# Altium footprint library Hare_Library.PcbLib: 252 footprints (part 4 of 16)
Each footprint in its own frame and in the unit in brackets; x right, y up, seen from the top. Pads: shape width x height; smd on the part's side, far side on the other; paste and mask are expansions set on the pad; w line width, h text height; cw(c..) or ccw(c..) is an arc to the next point about the centre after c.
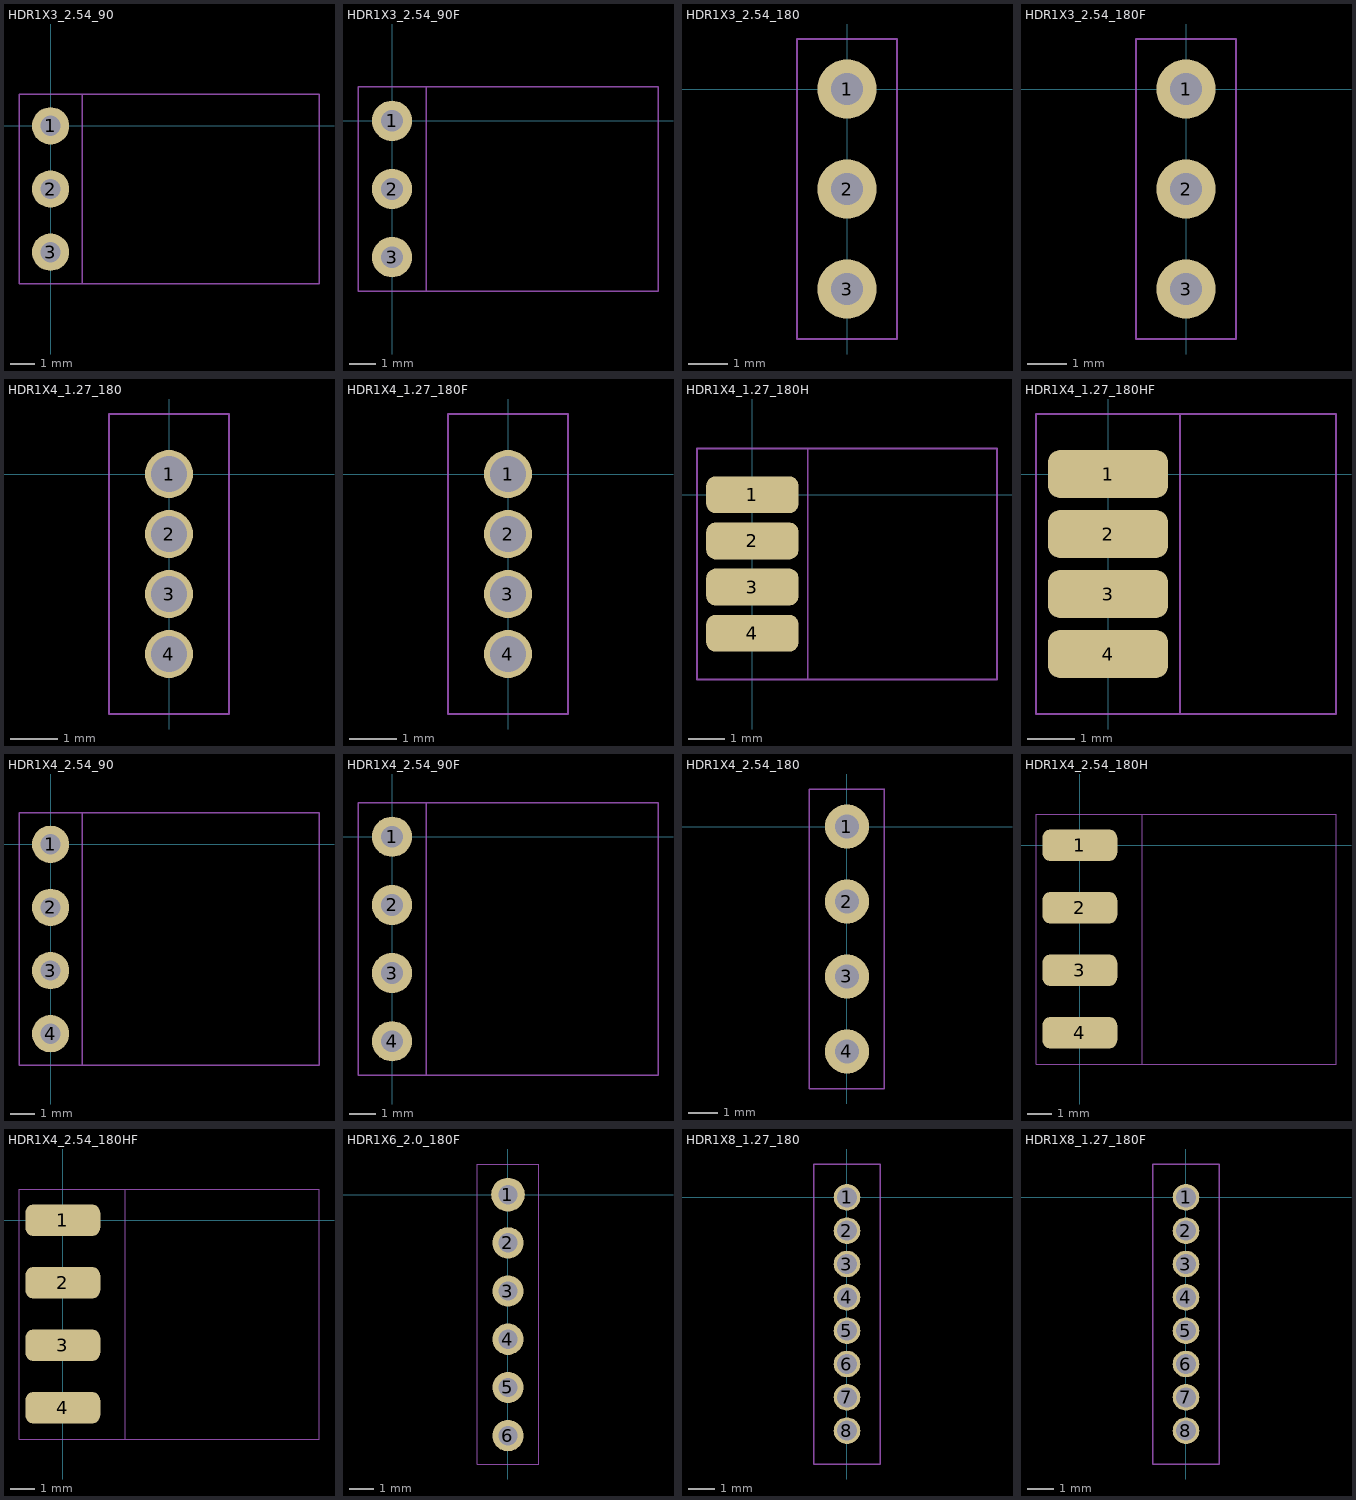
[diagram p3: the footprints below, top view; thin cyan lines are the x and y axes]

## HDR1X3_2.54_90 [mm]
height 4.3
pads (3):
  round 1.5 hole 0.813: 1(0,0) 2(0,-2.54) 3(0,-5.08)
Mechanical 13:
  lines w0.051: -1.27,-6.35 -1.27,1.27 10.795,1.27 10.795,-6.35 -1.27,-6.35
Mechanical 14:
  lines w0.051: -1.27,-6.35 1.27,-6.35 1.27,1.27 -1.27,1.27 -1.27,-6.35
3D body "pin_header_aw140-ea-g03g.stp": height 2.52, standoff -2.38, extent -0.381,-6.25 10.759,1.17

## HDR1X3_2.54_90F [mm]
height 4.3
pads (3):
  round 1.5 hole 0.813: 1(0,0) 2(0,-2.54) 3(0,-5.08)
Mechanical 13:
  lines w0.051: -1.27,-6.35 9.906,-6.35 9.906,1.27 -1.27,1.27 -1.27,-6.35
Mechanical 14:
  lines w0.051: -1.27,-6.35 -1.27,1.27 1.27,1.27 1.27,-6.35 -1.27,-6.35
3D body "female_header_a-bl254-ea-g03d.stp": height 2.52, standoff -3.18, extent -0.254,-6.475 9.806,1.395

## HDR1X3_2.54_180 [mm]
height 4.3
pads (3):
  round 1.5 hole 0.813: 1(0,0) 2(0,-2.54) 3(0,-5.08)
Mechanical 13:
  lines w0.051: -1.27,-6.35 1.27,-6.35 1.27,1.27 -1.27,1.27 -1.27,-6.35
Mechanical 14:
  lines w0.051: -1.27,-6.35 1.27,-6.35 1.27,1.27 -1.27,1.27 -1.27,-6.35
3D body "pin_header_aw140-eg-g03d.stp": height 8.2, standoff -3, extent -1.249,-6.35 1.249,1.27

## HDR1X3_2.54_180F [mm]
height 4.3
pads (3):
  round 1.5 hole 0.813: 1(0,0) 2(0,-2.54) 3(0,-5.08)
Mechanical 13:
  lines w0.051: -1.27,-6.35 1.27,-6.35 1.27,1.27 -1.27,1.27 -1.27,-6.35
Mechanical 14:
  lines w0.051: -1.27,-6.35 1.27,-6.35 1.27,1.27 -1.27,1.27 -1.27,-6.35
3D body "female_header_a-bl254-eg-g03d.stp": height 8.5, standoff -3.2, extent -1.25,-6.475 1.25,1.395

## HDR1X4_1.27_180 [mil]
height 169.29
pads (4):
  round 40 hole 30: 1(0,0) 2(0,-50) 3(0,-100) 4(0,-150)
Mechanical 13:
  lines w2: -50,-200 50,-200 50,50 -50,50 -50,-200
Mechanical 14:
  lines w2: -50,-200 50,-200 50,50 -50,50 -50,-200
3D body "pin_header_a-sl127-eg-g04d.stp": height 210.24, standoff -102.36, extent -49.21,-174.99 49.21,25.01

## HDR1X4_1.27_180F [mil]
height 169.29
pads (4):
  round 40 hole 30: 1(0,0) 2(0,-50) 3(0,-100) 4(0,-150)
Mechanical 13:
  lines w2: -50,-200 50,-200 50,50 -50,50 -50,-200
Mechanical 14:
  lines w2: -50,-200 50,-200 50,50 -50,50 -50,-200
3D body "female_header_a-bl127-eg-g04d.stp": height 133.86, standoff -94.49, extent -35.87,-182.88 35,32.88

## HDR1X4_1.27_180H [mil]
height 169.29
pads (4):
  rrect50% 100x40 smd: 1(0,0) 2(0,-50) 3(0,-100) 4(0,-150)
Mechanical 13:
  lines w2: -60,-200 -60,50 265,50 265,-200 -60,-200
Mechanical 14:
  lines w2: -60,-200 -60,50 60,50 60,-200 -60,-200
3D body "pin_header_a-sl127-eg-g04d.stp": height 59.21, standoff -39.21, extent -47.36,-174.99 265.24,25.01

## HDR1X4_1.27_180HF [mil]
height 169.29
pads (4):
  rrect50% 100x40 smd: 1(0,0) 2(0,-50) 3(0,-100) 4(0,-150)
Mechanical 13:
  lines w2: -60,-200 -60,50 190,50 190,-200 -60,-200
Mechanical 14:
  lines w2: -60,-200 60,-200 60,50 -60,50 -60,-200
3D body "female_header_a-bl127-eg-g04d.stp": height 45.43, standoff -25.43, extent -38.35,-182.88 190,32.88

## HDR1X4_2.54_90 [mm]
height 4.3
pads (4):
  round 1.5 hole 0.813: 1(0,0) 2(0,-2.54) 3(0,-5.08) 4(0,-7.62)
Mechanical 13:
  lines w0.051: -1.27,-8.89 10.795,-8.89 10.795,1.27 -1.27,1.27 -1.27,-8.89
Mechanical 14:
  lines w0.051: -1.27,-8.89 -1.27,1.27 1.27,1.27 1.27,-8.89 -1.27,-8.89
3D body "pin_header_aw140-ea-g04g.stp": height 2.52, standoff -2.38, extent -0.38,-8.79 10.76,1.17

## HDR1X4_2.54_90F [mm]
height 4.3
pads (4):
  round 1.5 hole 0.813: 1(0,0) 2(0,-2.54) 3(0,-5.08) 4(0,-7.62)
Mechanical 13:
  lines w0.051: -1.27,-8.89 -1.27,1.27 9.906,1.27 9.906,-8.89 -1.27,-8.89
Mechanical 14:
  lines w0.051: -1.27,-8.89 1.27,-8.89 1.27,1.27 -1.27,1.27 -1.27,-8.89
3D body "female_header_a-bl254-ea-g04d.stp": height 2.52, standoff -3.18, extent -0.254,-9.015 9.806,1.395

## HDR1X4_2.54_180 [mm]
height 4.3
pads (4):
  round 1.5 hole 0.813: 1(0,0) 2(0,-2.54) 3(0,-5.08) 4(0,-7.62)
Mechanical 13:
  lines w0.051: -1.27,-8.89 1.27,-8.89 1.27,1.27 -1.27,1.27 -1.27,-8.89
Mechanical 14:
  lines w0.051: -1.27,-8.89 1.27,-8.89 1.27,1.27 -1.27,1.27 -1.27,-8.89
3D body "pin_header_aw140-eg-g04d.stp": height 8.2, standoff -3, extent -1.249,-8.89 1.249,1.27

## HDR1X4_2.54_180H [mil]
height 169.29
pads (4):
  rrect50% 120x50 smd: 1(0,0) 2(0,-100) 3(0,-200) 4(0,-300)
Mechanical 13:
  lines w2: -70,-350 410,-350 410,50 -70,50 -70,-350
Mechanical 14:
  lines w2: -70,-350 -70,50 100,50 100,-350 -70,-350
3D body "pin_header_aw140-eg-g04d.stp": height 61.32, standoff -37.05, extent -35,-350 405.94,50

## HDR1X4_2.54_180HF [mil]
height 169.29
pads (4):
  rrect50% 120x50 smd: 1(0,0) 2(0,-100) 3(0,-200) 4(0,-300)
Mechanical 13:
  lines w2: -70,-350 -70,50 410,50 410,-350 -70,-350
Mechanical 14:
  lines w2: -70,-350 100,-350 100,50 -70,50 -70,-350

## HDR1X6_2.0_180F [mm]
height 4.3
pads (6):
  round 1.4 hole 0.8: 1(0,0)
  round 1.3 hole 0.8: 2(0,-2) 3(0,-4) 4(0,-6) 5(0,-8) 6(0,-10)
Mechanical 13:
  lines w0.051: -1.27,-11.176 1.27,-11.176 1.27,1.27 -1.27,1.27 -1.27,-11.176
Mechanical 14:
  lines w0.051: -1.27,-11.176 1.27,-11.176 1.27,1.27 -1.27,1.27 -1.27,-11.176

## HDR1X8_1.27_180 [mil]
height 169.29
pads (8):
  round 40 hole 30: 1(0,0) 2(0,-50) 3(0,-100) 4(0,-150) 5(0,-200) 6(0,-250) 7(0,-300) 8(0,-350)
Mechanical 13:
  lines w2: -50,-400 -50,50 50,50 50,-400 -50,-400
Mechanical 14:
  lines w2: -50,-400 -50,50 50,50 50,-400 -50,-400
3D body "pin_header_a-sl127-eg-z08d.stp": height 210.24, standoff -102.36, extent -49.21,-374.99 49.21,25.01

## HDR1X8_1.27_180F [mil]
height 169.29
pads (8):
  round 40 hole 30: 1(0,0) 2(0,-50) 3(0,-100) 4(0,-150) 5(0,-200) 6(0,-250) 7(0,-300) 8(0,-350)
Mechanical 13:
  lines w2: -50,-400 -50,50 50,50 50,-400 -50,-400
Mechanical 14:
  lines w2: -50,-400 -50,50 50,50 50,-400 -50,-400
3D body "female_header_a-bl127-eg-z08d.stp": height 133.86, standoff -94.49, extent -35.43,-382.88 35.43,32.87